# Altium footprint library Connectors_Old.PcbLib: 246 footprints (part 17 of 18)
Each footprint in its own frame and in the unit in brackets; x right, y up, seen from the top. Pads: shape width x height; smd on the part's side, far side on the other; paste and mask are expansions set on the pad; w line width, h text height; cw(c..) or ccw(c..) is an arc to the next point about the centre after c.
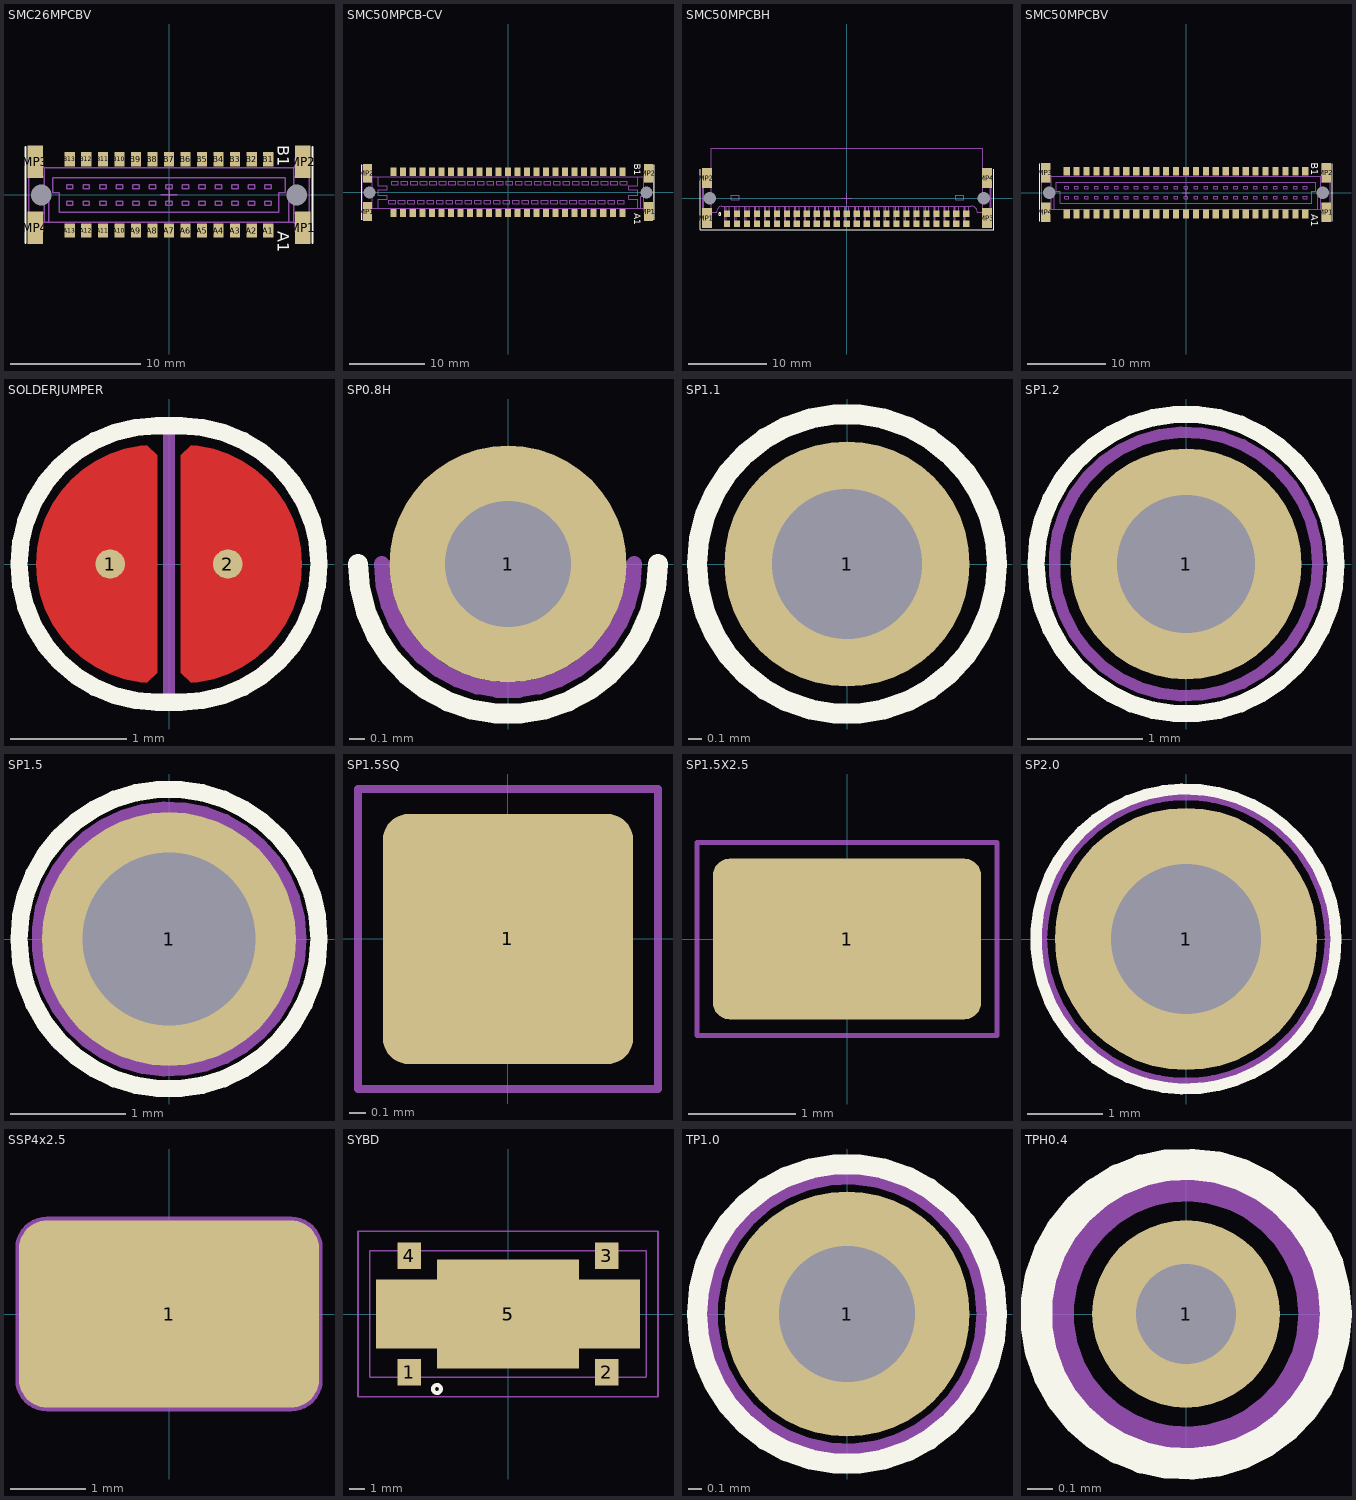
[diagram p16: the footprints below, top view; thin cyan lines are the x and y axes]

## SMC26MPCBV [mm] "ERNI SMC26 pin MALE VERT"
height 8
pads (32):
  rect 0.8x1.1 smd: A1(7.62,-2.743) A2(6.35,-2.743) A3(5.08,-2.743) A4(3.81,-2.743) A5(2.54,-2.743) A6(1.27,-2.743) A7(0,-2.743) A8(-1.27,-2.743) A9(-2.54,-2.743) A10(-3.81,-2.743) A11(-5.08,-2.743) A12(-6.35,-2.743) A13(-7.62,-2.743) B1(7.62,2.743) B2(6.35,2.743) B3(5.08,2.743) B4(3.81,2.743) B5(2.54,2.743) B6(1.27,2.743) B7(0,2.743) B8(-1.27,2.743) B9(-2.54,2.743) B10(-3.81,2.743) B11(-5.08,2.743) B12(-6.35,2.743) B13(-7.62,2.743)
  round 0 hole 1.6 unplated: MH1(-9.83,0) MH2(9.83,0)
  rect 1.2x2.5 smd: MP1(10.287,-2.54) MP2(10.287,2.54) MP3(-10.287,2.54) MP4(-10.287,-2.54)
Top Overlay:
  lines w0.15: -11.049,-3.683 -11.049,3.683 ; 11.049,-3.683 11.049,3.683
  text "B1" at 8.382,3.81 h0.89
  text "A1" at 8.382,-2.794 h0.89
Mechanical 13:
  lines w0.102: -10.78,-1.4 -9.605,-1.4 ; -10.78,1.4 -9.605,1.4 ; -9.655,-2.1 9.605,-2.1 ; -9.605,-0.525 -9.23,-0.525 -9.23,-2.1 ; -9.605,2.083 9.605,2.083 ; -8.433,-1.35 8.43,-1.35 8.43,0.175 8.93,0.175 8.93,1.325 -8.93,1.325 -8.93,0.175 -8.43,0.175 ; -8.433,-1.346 -8.433,0.178 ; 9.205,-2.1 9.205,-0.5 9.605,-0.5 ; 9.605,-1.4 10.78,-1.4 ; 9.605,1.4 10.78,1.4 ; 9.605,-2.1 9.705,-2.2 9.705,-2.8 9.78,-2.875 9.78,-3.6 10.78,-3.6 10.78,3.6 9.78,3.6 9.78,2.85 9.705,2.775 9.705,2.2 9.605,2.1 9.605,-2.1 ; -10.78,-3.6 -9.78,-3.6 -9.78,-2.875 -9.705,-2.8 -9.705,-2.2 -9.605,-2.1 -9.605,2.1 -9.705,2.2 -9.705,2.775 -9.78,2.85 -9.78,3.6 -10.78,3.6 -10.78,-3.6 ; -7.86,-0.8 -7.86,-0.5 -7.385,-0.5 -7.385,-0.8 -7.86,-0.8 ; -7.86,0.475 -7.385,0.475 -7.385,0.775 -7.86,0.775 -7.86,0.475 ; -6.59,-0.8 -6.59,-0.5 -6.115,-0.5 -6.115,-0.8 -6.59,-0.8 ; -6.59,0.475 -6.115,0.475 -6.115,0.775 -6.59,0.775 -6.59,0.475 ; -5.32,-0.8 -5.32,-0.5 -4.845,-0.5 -4.845,-0.8 -5.32,-0.8 ; -5.32,0.475 -4.845,0.475 -4.845,0.775 -5.32,0.775 -5.32,0.475 ; -4.05,-0.8 -4.05,-0.5 -3.575,-0.5 -3.575,-0.8 -4.05,-0.8 ; -4.05,0.475 -3.575,0.475 -3.575,0.775 -4.05,0.775 -4.05,0.475 ; -2.78,-0.8 -2.78,-0.5 -2.305,-0.5 -2.305,-0.8 -2.78,-0.8 ; -2.78,0.475 -2.305,0.475 -2.305,0.775 -2.78,0.775 -2.78,0.475 ; -1.51,-0.8 -1.51,-0.5 -1.035,-0.5 -1.035,-0.8 -1.51,-0.8 ; -1.51,0.475 -1.035,0.475 -1.035,0.775 -1.51,0.775 -1.51,0.475 ; -0.24,-0.8 -0.24,-0.5 0.235,-0.5 0.235,-0.8 -0.24,-0.8 ; -0.24,0.475 0.235,0.475 0.235,0.775 -0.24,0.775 -0.24,0.475 ; 1.03,-0.8 1.505,-0.8 1.505,-0.5 1.03,-0.5 1.03,-0.8 ; 1.03,0.475 1.03,0.775 1.505,0.775 1.505,0.475 1.03,0.475 ; 2.3,-0.8 2.775,-0.8 2.775,-0.5 2.3,-0.5 2.3,-0.8 ; 2.3,0.475 2.3,0.775 2.775,0.775 2.775,0.475 2.3,0.475 ; 3.57,-0.8 4.045,-0.8 4.045,-0.5 3.57,-0.5 3.57,-0.8 ; 3.57,0.475 3.57,0.775 4.045,0.775 4.045,0.475 3.57,0.475 ; 4.84,-0.8 5.315,-0.8 5.315,-0.5 4.84,-0.5 4.84,-0.8 ; 4.84,0.475 4.84,0.775 5.315,0.775 5.315,0.475 4.84,0.475 ; 6.11,-0.8 6.585,-0.8 6.585,-0.5 6.11,-0.5 6.11,-0.8 ; 6.11,0.475 6.11,0.775 6.585,0.775 6.585,0.475 6.11,0.475 ; 7.38,-0.8 7.38,-0.5 7.855,-0.5 7.855,-0.8 7.38,-0.8 ; 7.38,0.475 7.855,0.475 7.855,0.775 7.38,0.775 7.38,0.475
Mechanical 15:
  lines w0.102: -0.635,0 0.635,0 ; 0,-0.635 0,0.635
3D body: height 6.77, standoff -0.73, extent -10.795,-3.6 10.795,3.6

## SMC50MPCB-CV [mm] "ERNI SMT50pin CABLE on BOARD"
height 5
pads (56):
  rect 0.8x1.1 smd: A1(15.24,-2.75) A2(13.97,-2.75) A3(12.7,-2.75) A4(11.43,-2.75) A5(10.16,-2.75) A6(8.89,-2.75) A7(7.62,-2.75) A8(6.35,-2.75) A9(5.08,-2.75) A10(3.81,-2.75) A11(2.54,-2.75) A12(1.27,-2.75) A13(0,-2.75) A14(-1.27,-2.75) A15(-2.54,-2.75) A16(-3.81,-2.75) A17(-5.08,-2.75) A18(-6.35,-2.75) A19(-7.62,-2.75) A20(-8.89,-2.75) A21(-10.16,-2.75) A22(-11.43,-2.75) A23(-12.7,-2.75) A24(-13.97,-2.75) A25(-15.24,-2.75) B1(15.24,2.75) B2(13.97,2.75) B3(12.7,2.75) B4(11.43,2.75) B5(10.16,2.75) B6(8.89,2.75) B7(7.62,2.75) B8(6.35,2.75) B9(5.08,2.75) B10(3.81,2.75) B11(2.54,2.75) B12(1.27,2.75) B13(0,2.75) B14(-1.27,2.75) B15(-2.54,2.75) B16(-3.81,2.75) B17(-5.08,2.75) B18(-6.35,2.75) B19(-7.62,2.75) B20(-8.89,2.75) B21(-10.16,2.75) B22(-11.43,2.75) B23(-12.7,2.75) B24(-13.97,2.75) B25(-15.24,2.75)
  round 0 hole 1.6 unplated: MH1(18.45,0) MH2(-18.45,0)
  rect 1.2x2.5 smd: MP1(-18.75,-2.55) MP1(18.75,-2.55) MP2(-18.75,2.55) MP2(18.75,2.55)
Top Overlay:
  lines w0.15: -19.532,-3.651 -19.532,3.715 ; 19.532,-3.651 19.532,3.715
  text "A1" at 16.865,-2.762 h0.89
  text "B1" at 16.865,3.842 h0.89
Mechanical 13:
  drawing of 250 lines, arcs and shapes, not listed
3D body: height 1, standoff 0, extent -15.494,-3.175 -14.986,-2.1
3D body: height 1, standoff 0, extent -14.224,-3.175 -13.716,-2.1
3D body: height 1, standoff 0, extent -12.954,-3.175 -12.446,-2.1
3D body: height 1, standoff 0, extent -11.684,-3.175 -11.176,-2.1
3D body: height 1, standoff 0, extent -10.414,-3.175 -9.906,-2.1
3D body: height 1, standoff 0, extent -9.144,-3.175 -8.636,-2.1
3D body: height 1, standoff 0, extent -7.874,-3.175 -7.366,-2.1
3D body: height 1, standoff 0, extent -6.604,-3.175 -6.096,-2.1
3D body: height 1, standoff 0, extent -5.334,-3.175 -4.826,-2.1
3D body: height 1, standoff 0, extent -4.064,-3.175 -3.556,-2.1
3D body: height 1, standoff 0, extent -2.794,-3.175 -2.286,-2.1
3D body: height 1, standoff 0, extent -1.524,-3.175 -1.016,-2.1
3D body: height 1, standoff 0, extent -0.254,-3.175 0.254,-2.1
3D body: height 1, standoff 0, extent 1.016,-3.175 1.524,-2.1
3D body: height 1, standoff 0, extent 2.286,-3.175 2.794,-2.1
3D body: height 1, standoff 0, extent 3.556,-3.175 4.064,-2.1
3D body: height 1, standoff 0, extent 4.826,-3.175 5.334,-2.1
3D body: height 1, standoff 0, extent 6.096,-3.175 6.604,-2.1
3D body: height 1, standoff 0, extent 7.366,-3.175 7.874,-2.1
3D body: height 1, standoff 0, extent 8.636,-3.175 9.144,-2.1
3D body: height 1, standoff 0, extent 9.906,-3.175 10.414,-2.1
3D body: height 1, standoff 0, extent 11.176,-3.175 11.684,-2.1
3D body: height 1, standoff 0, extent 12.446,-3.175 12.954,-2.1
3D body: height 1, standoff 0, extent 13.716,-3.175 14.224,-2.1
3D body: height 1, standoff 0, extent 14.986,-3.175 15.494,-2.1
3D body: height 1, standoff 0, extent 14.986,2.1 15.494,3.175
3D body: height 1, standoff 0, extent 13.716,2.1 14.224,3.175
3D body: height 1, standoff 0, extent 12.446,2.1 12.954,3.175
3D body: height 1, standoff 0, extent 11.176,2.1 11.684,3.175
3D body: height 1, standoff 0, extent 9.906,2.1 10.414,3.175
3D body: height 1, standoff 0, extent 8.636,2.1 9.144,3.175
3D body: height 1, standoff 0, extent 7.366,2.1 7.874,3.175
3D body: height 1, standoff 0, extent 6.096,2.1 6.604,3.175
3D body: height 1, standoff 0, extent 4.826,2.1 5.334,3.175
3D body: height 1, standoff 0, extent 3.556,2.1 4.064,3.175
3D body: height 1, standoff 0, extent 2.286,2.1 2.794,3.175
3D body: height 1, standoff 0, extent 1.016,2.1 1.524,3.175
3D body: height 1, standoff 0, extent -0.254,2.1 0.254,3.175
3D body: height 1, standoff 0, extent -1.524,2.1 -1.016,3.175
3D body: height 1, standoff 0, extent -2.794,2.1 -2.286,3.175
3D body: height 1, standoff 0, extent -4.064,2.1 -3.556,3.175
3D body: height 1, standoff 0, extent -5.334,2.1 -4.826,3.175
3D body: height 1, standoff 0, extent -6.604,2.1 -6.096,3.175
3D body: height 1, standoff 0, extent -7.874,2.1 -7.366,3.175
3D body: height 1, standoff 0, extent -9.144,2.1 -8.636,3.175
3D body: height 1, standoff 0, extent -10.414,2.1 -9.906,3.175
3D body: height 1, standoff 0, extent -11.684,2.1 -11.176,3.175
3D body: height 1, standoff 0, extent -12.954,2.1 -12.446,3.175
3D body: height 1, standoff 0, extent -14.224,2.1 -13.716,3.175
3D body: height 1, standoff 0, extent -15.494,2.1 -14.986,3.175
3D body: height 2.5, standoff 0, extent -18.088,-2.1 18.088,2.1
3D body: height 2, standoff 0, extent 18.088,-3.568 19.415,3.632
3D body: height 2, standoff 0, extent -19.415,-3.568 -18.088,3.632
3D body: height 5, standoff 2.5, extent -18.088,-2.1 -16.129,2.132
3D body: height 5, standoff 2.5, extent 16.129,-2.1 18.088,2.132
3D body: height 5, standoff 2.5, extent -15.494,1.016 -14.605,1.524
3D body: height 5, standoff 2.5, extent -14.224,1.016 -13.335,1.524
3D body: height 5, standoff 2.5, extent -11.684,1.016 -10.795,1.524
3D body: height 5, standoff 2.5, extent -12.954,1.016 -12.065,1.524
3D body: height 5, standoff 2.5, extent -7.874,1.016 -6.985,1.524
3D body: height 5, standoff 2.5, extent -6.604,1.016 -5.715,1.524
3D body: height 5, standoff 2.5, extent -9.144,1.016 -8.255,1.524
3D body: height 5, standoff 2.5, extent -10.414,1.016 -9.525,1.524
3D body: height 5, standoff 2.5, extent -0.254,1.016 0.635,1.524
3D body: height 5, standoff 2.5, extent 1.016,1.016 1.905,1.524
3D body: height 5, standoff 2.5, extent 3.556,1.016 4.445,1.524
3D body: height 5, standoff 2.5, extent 2.286,1.016 3.175,1.524
3D body: height 5, standoff 2.5, extent -2.794,1.016 -1.905,1.524
3D body: height 5, standoff 2.5, extent -1.524,1.016 -0.635,1.524
3D body: height 5, standoff 2.5, extent -4.064,1.016 -3.175,1.524
3D body: height 5, standoff 2.5, extent -5.334,1.016 -4.445,1.524
3D body: height 5, standoff 2.5, extent 9.906,1.016 10.795,1.524
3D body: height 5, standoff 2.5, extent 11.176,1.016 12.065,1.524
3D body: height 5, standoff 2.5, extent 13.716,1.016 14.605,1.524
3D body: height 5, standoff 2.5, extent 12.446,1.016 13.335,1.524
3D body: height 5, standoff 2.5, extent 7.366,1.016 8.255,1.524
3D body: height 5, standoff 2.5, extent 8.636,1.016 9.525,1.524
3D body: height 5, standoff 2.5, extent 6.096,1.016 6.985,1.524
3D body: height 5, standoff 2.5, extent 4.826,1.016 5.715,1.524
3D body: height 5, standoff 2.5, extent 14.986,1.016 15.875,1.524
3D body: height 5, standoff 2.5, extent 14.605,-1.524 15.494,-1.016
3D body: height 5, standoff 2.5, extent 4.445,-1.524 5.334,-1.016
3D body: height 5, standoff 2.5, extent 5.715,-1.524 6.604,-1.016
3D body: height 5, standoff 2.5, extent 8.255,-1.524 9.144,-1.016
3D body: height 5, standoff 2.5, extent 6.985,-1.524 7.874,-1.016
3D body: height 5, standoff 2.5, extent 12.065,-1.524 12.954,-1.016
3D body: height 5, standoff 2.5, extent 13.335,-1.524 14.224,-1.016
3D body: height 5, standoff 2.5, extent 10.795,-1.524 11.684,-1.016
3D body: height 5, standoff 2.5, extent 9.525,-1.524 10.414,-1.016
3D body: height 5, standoff 2.5, extent -5.715,-1.524 -4.826,-1.016
3D body: height 5, standoff 2.5, extent -4.445,-1.524 -3.556,-1.016
3D body: height 5, standoff 2.5, extent -1.905,-1.524 -1.016,-1.016
3D body: height 5, standoff 2.5, extent -3.175,-1.524 -2.286,-1.016
3D body: height 5, standoff 2.5, extent 1.905,-1.524 2.794,-1.016
3D body: height 5, standoff 2.5, extent 3.175,-1.524 4.064,-1.016
3D body: height 5, standoff 2.5, extent 0.635,-1.524 1.524,-1.016
3D body: height 5, standoff 2.5, extent -0.635,-1.524 0.254,-1.016
3D body: height 5, standoff 2.5, extent -10.795,-1.524 -9.906,-1.016
3D body: height 5, standoff 2.5, extent -9.525,-1.524 -8.636,-1.016
3D body: height 5, standoff 2.5, extent -6.985,-1.524 -6.096,-1.016
3D body: height 5, standoff 2.5, extent -8.255,-1.524 -7.366,-1.016
3D body: height 5, standoff 2.5, extent -13.335,-1.524 -12.446,-1.016
3D body: height 5, standoff 2.5, extent -12.065,-1.524 -11.176,-1.016
3D body: height 5, standoff 2.5, extent -14.605,-1.524 -13.716,-1.016
3D body: height 5, standoff 2.5, extent -15.875,-1.524 -14.986,-1.016

## SMC50MPCBH [mm] "ERNI SMC50 pin MALE HOR"
height 4.2
pads (56):
  rect 0.8x0.8 smd: A1(-15.24,-2.007) A2(-13.97,-2.007) A3(-12.7,-2.007) A4(-11.43,-2.007) A5(-10.16,-2.007) A6(-8.89,-2.007) A7(-7.62,-2.007) A8(-6.35,-2.007) A9(-5.08,-2.007) A10(-3.81,-2.007) A11(-2.54,-2.007) A12(-1.27,-2.007) A13(0,-2.007) A14(1.27,-2.007) A15(2.54,-2.007) A16(3.81,-2.007) A17(5.08,-2.007) A18(6.35,-2.007) A19(7.62,-2.007) A20(8.89,-2.007) A21(10.16,-2.007) A22(11.43,-2.007) A23(12.7,-2.007) A24(13.97,-2.007) A25(15.24,-2.007) B1(-15.24,-3.277) B2(-13.97,-3.277) B3(-12.7,-3.277) B4(-11.43,-3.277) B5(-10.16,-3.277) B6(-8.89,-3.277) B7(-7.62,-3.277) B8(-6.35,-3.277) B9(-5.08,-3.277) B10(-3.81,-3.277) B11(-2.54,-3.277) B12(-1.27,-3.277) B13(0,-3.277) B14(1.27,-3.277) B15(2.54,-3.277) B16(3.81,-3.277) B17(5.08,-3.277) B18(6.35,-3.277) B19(7.62,-3.277) B20(8.89,-3.277) B21(10.16,-3.277) B22(11.43,-3.277) B23(12.7,-3.277) B24(13.97,-3.277) B25(15.24,-3.277)
  round 0 hole 1.6 unplated: MH1(-17.45,0) MH2(17.45,0)
  rect 1.219x2.54 smd: MP1(-17.805,-2.54) MP2(-17.805,2.54) MP3(17.875,-2.54) MP4(17.875,2.54)
Top Overlay:
  circle w0.15: c-16.18,-2.032 r0.152
  lines w0.15: -18.669,3.683 -18.669,-4.064 18.739,-4.064 18.739,3.683
Mechanical 13:
  drawing of 238 lines, arcs and shapes, not listed
Mechanical 15:
  lines w0.102: -0.635,0 0.635,0 ; 0,-0.635 0,0.635
3D body: height 4.27, standoff -0.68, extent -18.35,-3.619 18.35,6.381

## SMC50MPCBV [mm] "ERNI SMC 50 pin MALE VERT"
pads (56):
  rect 0.8x1.1 smd: A1(15.24,-2.743) A2(13.97,-2.743) A3(12.7,-2.743) A4(11.43,-2.743) A5(10.16,-2.743) A6(8.89,-2.743) A7(7.62,-2.743) A8(6.35,-2.743) A9(5.08,-2.743) A10(3.81,-2.743) A11(2.54,-2.743) A12(1.27,-2.743) A13(0,-2.743) A14(-1.27,-2.743) A15(-2.54,-2.743) A16(-3.81,-2.743) A17(-5.08,-2.743) A18(-6.35,-2.743) A19(-7.62,-2.743) A20(-8.89,-2.743) A21(-10.16,-2.743) A22(-11.43,-2.743) A23(-12.7,-2.743) A24(-13.97,-2.743) A25(-15.24,-2.743) B1(15.24,2.743) B2(13.97,2.743) B3(12.7,2.743) B4(11.43,2.743) B5(10.16,2.743) B6(8.89,2.743) B7(7.62,2.743) B8(6.35,2.743) B9(5.08,2.743) B10(3.81,2.743) B11(2.54,2.743) B12(1.27,2.743) B13(0,2.743) B14(-1.27,2.743) B15(-2.54,2.743) B16(-3.81,2.743) B17(-5.08,2.743) B18(-6.35,2.743) B19(-7.62,2.743) B20(-8.89,2.743) B21(-10.16,2.743) B22(-11.43,2.743) B23(-12.7,2.743) B24(-13.97,2.743) B25(-15.24,2.743)
  round 0 hole 1.6 unplated: MH1(-17.45,0) MH2(17.45,0)
  rect 1.2x2.5 smd: MP1(17.907,-2.54) MP2(17.907,2.54) MP3(-17.907,2.54) MP4(-17.907,-2.54)
Top Overlay:
  lines w0.15: -18.669,-3.683 -18.669,3.683 ; 18.669,-3.683 18.669,3.683
  text "B1" at 16.002,3.81 h0.89
  text "A1" at 16.002,-2.794 h0.89
Mechanical 13:
  drawing of 242 lines, arcs and shapes, not listed
Mechanical 15:
  lines w0.102: -0.508,0 0.508,0 ; 0,-0.508 0,0.508
3D body: height 2, standoff 0, extent -18.4,-3.6 -16.825,3.6
3D body: height 2, standoff 0, extent 16.825,-3.6 18.4,3.6
3D body: height 9, standoff 0, extent -17.225,-2.1 17.225,2.1
3D body: height 3, standoff 0, extent -16.55,-1.35 16.55,1.325

## SOLDERJUMPER [mil] "PCB solder jumper"
pads (3):
  round 10 smd paste-20 mask-20: 1(-20,0) 2(20,0)
  oval 96x88 on Top Solder mask+0: ""(0,0)
Top Layer:
  region: -4,36.96 -4,-36.96 -7.65,-40.38 -9.8,-40.24 -15,-39.2 -20.03,-37.5 -24.79,-35.15 -29.21,-32.2 -33.2,-28.7 -36.7,-24.71 -39.65,-20.29 -42,-15.53 -43.7,-10.5 -44.74,-5.3 -45.09,0 -44.74,5.3 -43.7,10.5 -42,15.53 -39.65,20.29 -36.7,24.71 -33.2,28.7 -29.21,32.2 -24.79,35.15 -20.03,37.5 -15,39.2 -9.8,40.24 -7.65,40.38
  region: 4,36.96 4,-36.96 7.65,-40.38 9.8,-40.24 15,-39.2 20.03,-37.5 24.79,-35.15 29.21,-32.2 33.2,-28.7 36.7,-24.71 39.65,-20.29 42,-15.53 43.7,-10.5 44.74,-5.3 45.09,0 44.74,5.3 43.7,10.5 42,15.53 39.65,20.29 36.7,24.71 33.2,28.7 29.21,32.2 24.79,35.15 20.03,37.5 15,39.2 9.8,40.24 7.65,40.38
Top Overlay:
  lines w5.91: -4,-47 cw(c-4,0) -4,47 4,47 cw(c4,0) 4,-47 -4,-47
Mechanical 13:
  lines w4: -4,-47 cw(c-4,0) -4,47 ; 4,-47 ccw(c4,0) 4,47
  lines w4.02: -4,-47 4,-47 ; -4,47 4,47 ; 0,-47 0,47

## SP0.8H [mm] "Solder pad 0.8mm half moon"
pads (1):
  round 1.5 hole 0.8: 1(0,0)
Top Overlay:
  lines w0.127: -0.95,0 ccw(c0,0) 0.95,0
Mechanical 13:
  lines w0.1: -0.8,0 ccw(c0,0) 0.8,0

## SP1.1 [mm] "Solder Pad 1.1mm"
pads (1):
  round 1.8 hole 1.1: 1(0,0)
Top Overlay:
  circle w0.15: c0,0 r1.1
Mechanical 13:
  circle w0.1: c0,0 r1.1

## SP1.2 [mm] "Solder Pad 1.2mm"
pads (1):
  round 2 hole 1.2: 1(0,0)
Top Overlay:
  circle w0.15: c0,0 r1.3
Mechanical 13:
  circle w0.1: c0,0 r1.143

## SP1.5 [mm] "Solder Pad 1.5mm"
pads (1):
  round 2.2 hole 1.5: 1(0,0)
Top Overlay:
  circle w0.15: c0,0 r1.3
Mechanical 13:
  circle w0.1: c0,0 r1.143

## SP1.5SQ [mm] "Solder Pad 1.5mm SMT"
pads (1):
  rrect20% 1.5x1.5 smd: 1(0,0)
Mechanical 13:
  lines w0.05: -0.9,-0.9 0.9,-0.9 0.9,0.9 -0.9,0.9 -0.9,-0.9

## SP1.5X2.5 [mm] "Solder Pad 1.5x2.5mm SMT"
pads (1):
  rrect20% 2.5x1.5 smd: 1(0,0)
Mechanical 13:
  lines w0.05: -1.4,-0.9 1.4,-0.9 1.4,0.9 -1.4,0.9 -1.4,-0.9

## SP2.0 [mm] "Solder Pin 2.0mm"
pads (1):
  round 3.5 hole 2: 1(0,0)
Top Overlay:
  circle w0.15: c0,0 r2
Mechanical 13:
  circle w0.1: c0,0 r1.9

## SSP4x2.5 [mm] "Solder pad 4x2.5mm SMD"
pads (1):
  rrect30% 4x2.5 smd: 1(0,0)
Mechanical 13:
  lines w0.1: -2,-0.875 ccw(c-1.625,-0.875) -1.625,-1.25 1.625,-1.25 ccw(c1.625,-0.875) 2,-0.875 2,0.875 ccw(c1.625,0.875) 1.625,1.25 -1.625,1.25 ccw(c-1.625,0.875) -2,0.875 -2,-0.875

## SYBD [mil] "High Power Bi-Directional Coupler"
height 129.92
pads (6):
  rect 60x67 smd: 1(-250,-147.5) 2(250,-147.5) 3(250,147.5) 4(-250,147.5)
  rect 670x175 smd: 5(0,0)
  rect 360x275 smd: 5(0,0)
Top Overlay:
  circle w10: c-180,-190 r10
Top Solder:
  rectangle: -340,-47.5 340,47.5
  region: -186,143 -186,88 186,88 186,143
  region: -186,-143 -186,-88 186,-88 186,-143
Mechanical 13:
  lines w4: -350,-160 -350,160 350,160 350,-160 -350,-160
Mechanical 15:
  lines w4: -380,-210 -380,210 380,210 380,-210 -380,-210
3D body: height 131, standoff 130, extent -170,-130 -130.16,-90.08
3D body: height 130, standoff 60, extent -200,-150 200,150
3D body: height 60, standoff 0, extent -350,-160 350,160

## TP1.0 [mm]
pads (1):
  round 1.8 hole 1: 1(0,0)
Top Overlay:
  circle w0.15: c0,0 r1.1
Mechanical 13:
  circle w0.1: c0,0 r1

## TPH0.4 [mm] "Test point TH 0.4mm"
pads (1):
  round 0.75 hole 0.4: 1(0,0)
Top Overlay:
  circle w0.127: c0,0 r0.6
Mechanical 13:
  circle w0.1: c0,0 r0.5